# Altium footprint library chipfc_libs.PCBLIB: 391 footprints (part 4 of 25)
Each footprint in its own frame and in the unit in brackets; x right, y up, seen from the top. Pads: shape width x height; smd on the part's side, far side on the other; paste and mask are expansions set on the pad; w line width, h text height; cw(c..) or ccw(c..) is an arc to the next point about the centre after c.
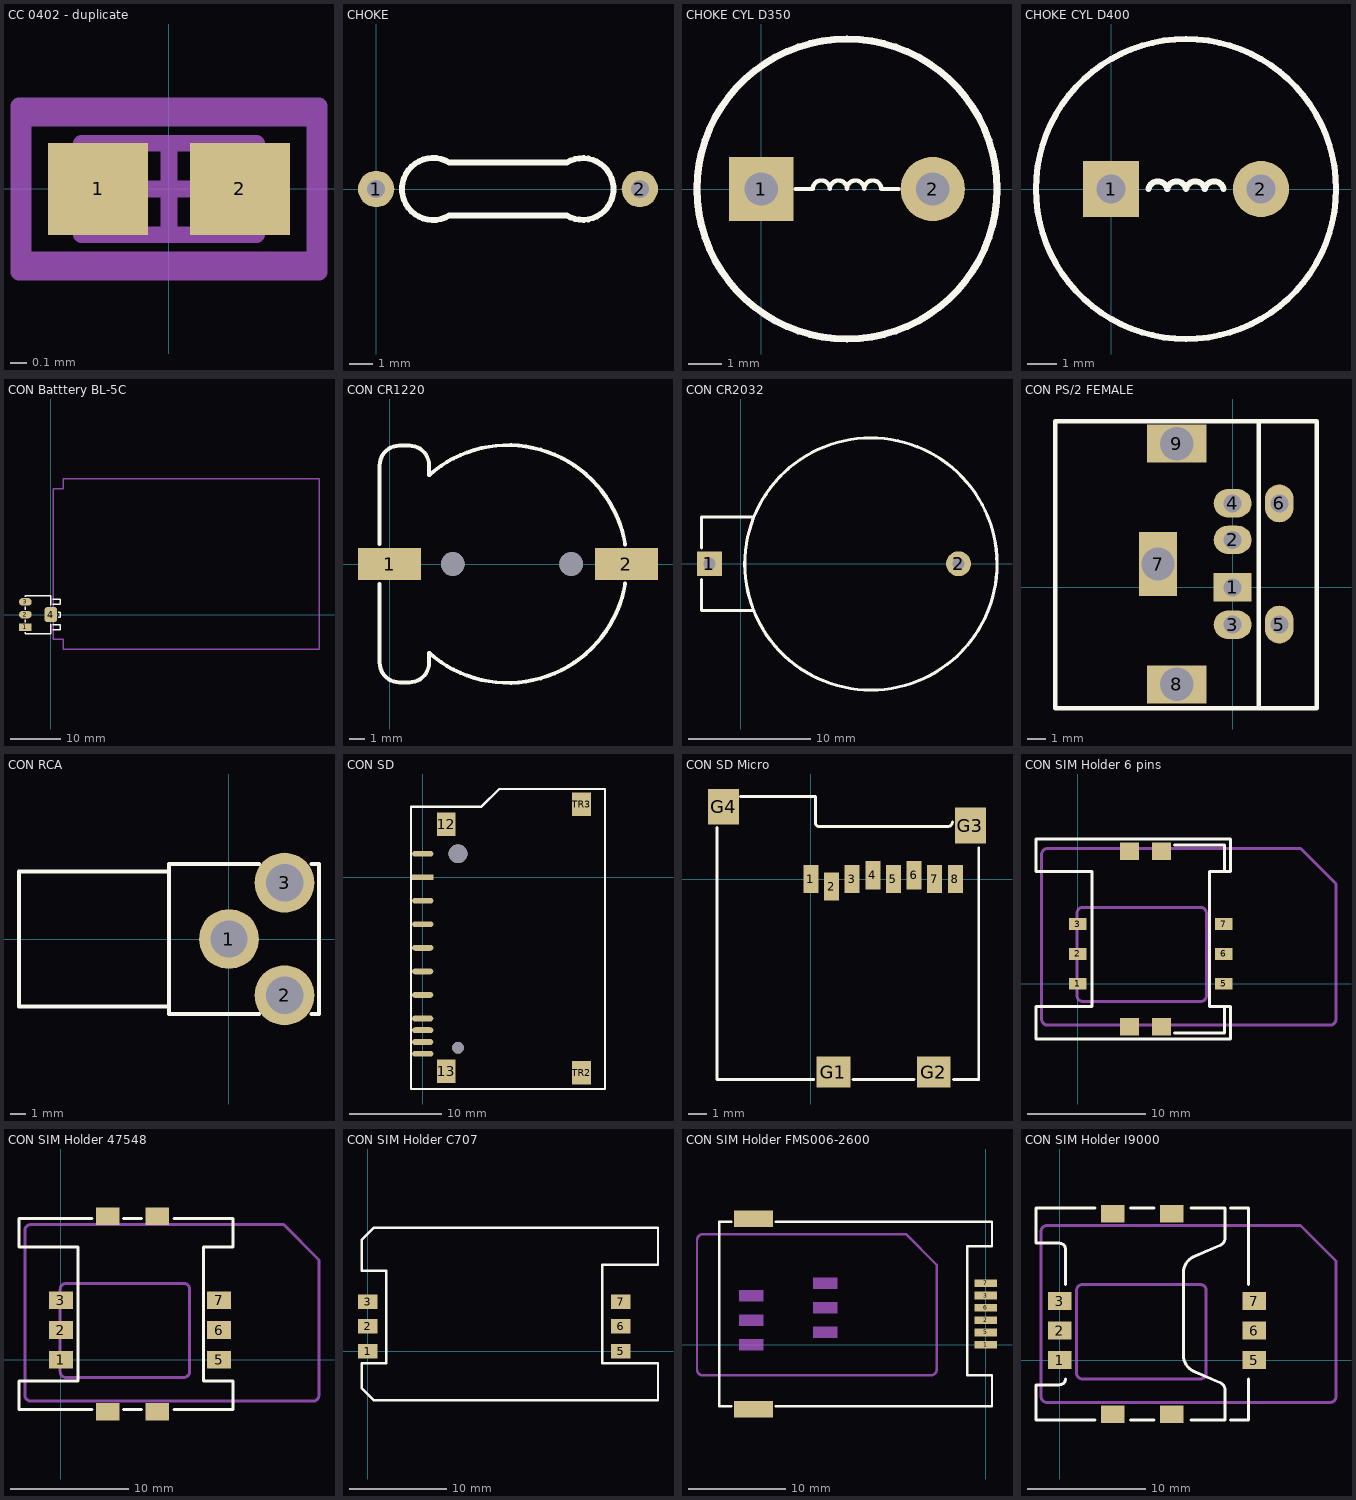
[diagram p3: the footprints below, top view; thin cyan lines are the x and y axes]

## CC 0402 - duplicate [mm] "Chip Capacitor, 2-Leads, Body 1.0x0.5mm, IPC Medium Density"
height 0.55
pads (2):
  rect 0.6x0.55 smd: 1(-0.425,0) 2(0.425,0)
Mechanical 13:
  lines w0.1: -0.525,-0.275 0.525,-0.275 0.525,0.275 -0.525,0.275 -0.525,-0.275
Mechanical 15:
  lines w0.1: -0.275,0 0.275,0 ; 0,-0.275 0,0.275 ; -0.875,-0.425 0.875,-0.425 0.875,0.425 -0.875,0.425 -0.875,-0.425
Mechanical 31:
  lines w0.1: -0.9,-0.5 0.9,-0.5 0.9,0.5 -0.9,0.5 -0.9,-0.5
3D body "User Library-CAPC1005X06.step": height 0.6, standoff 0, extent -0.5,-0.25 0.5,0.25

## CHOKE [mil]
pads (2):
  round 62 / inner round 52 / far side round 62 hole 31: 1(0,0) 2(450,0)
Top Overlay:
  lines w10: 125,-45 cw(c97.03,0) 125,45 325,45 cw(c352.35,0) 325,-45 125,-45

## CHOKE CYL D350 [mil]
pads (2):
  rect 75x75 hole 39: 1(0,0)
  round 75 hole 39: 2(200,0)
Top Overlay:
  lines w5: 40,0 50,0 60,0 cw(c70,0) 80,0 cw(c90,0) 100,0 cw(c110,0) 120,0 cw(c130,0) 140,0 150,0 160,0
  lines w8: -75,0 ccw(c100,0) 100,-175 ccw(c100,0) 275,0 ccw(c100,0) 100,175 ccw(c100,0) -75,0
Mechanical 1:
  lines w8: -75,0 cw(c100,0) 100,175 cw(c100,0) 275,0 cw(c100,0) 100,-175 cw(c100,0) -75,0

## CHOKE CYL D400 [mil]
pads (2):
  rect 75x75 / inner round 60 / far side rect 75x75 hole 39: 1(0,0)
  round 75 / inner round 60 / far side round 75 hole 39: 2(200,0)
Top Overlay:
  lines w8: 50,0 cw(c62.5,-2.5) 75,0 cw(c87.5,-2.5) 100,0 cw(c112.5,-2.5) 125,0 cw(c137.5,-2.5) 150,0 ; -100,0 cw(c100,0) 100,200 cw(c100,0) 300,0 cw(c100,0) 100,-200 cw(c100,0) -100,0
Mechanical 1:
  lines w8: -100,0 ccw(c100,0) 100,-200 ccw(c100,0) 300,0 ccw(c100,0) 100,200 ccw(c100,0) -100,0

## CON Batttery BL-5C [mil]
pads (4):
  rect 100x60 smd: 1(-200,-100)
  oval 100x60 smd: 2(-200,0) 3(-200,100)
  rrect50% 100x120 smd: 4(0,0)
Top Overlay:
  lines w10: -200,-140 -200,-150 0,-150 0,-75 ; -200,-60 -200,-40 ; -200,40 -200,60 ; -200,140 -200,150 0,150 0,75 ; 15,-120 75,-120 75,-80 15,-80 ; 15,80 75,80 75,120 15,120 ; 60,-20 75,-20 75,20 60,20
Mechanical 1:
  lines w10: 19.69,-193.11 98.43,-193.11 98.43,-271.85 2106.3,-271.85 2106.3,1066.73 98.43,1066.73 98.43,987.99 19.69,987.99 19.69,-193.11

## CON CR1220 [mil]
height 393.7
pads (4):
  rect 160x80 smd: 1(0,0) 2(600,0)
  round 60 hole 60 unplated: ""(160,0) ""(460,0)
Top Overlay:
  lines w10: -25,-50 -25,-250 ccw(c25,-250) 25,-300 50,-300 ccw(c50,-250) 100,-250 100,-225 ccw(c300,0) 596.94,-49.49 ; -25,50 -25,250 cw(c25,250) 25,300 50,300 cw(c50,250) 100,250 100,225 cw(c300,0) 596.94,49.49
3D body "User Library-cr1220.STEP": height 159.49, standoff -35, extent -64.17,-295.43 664.17,295

## CON CR2032 [mil]
height 393.7
pads (2):
  rect 80x80 / inner round 60 / far side rect 80x80 hole 39: 1(-100,0)
  round 80 / inner round 60 / far side round 80 hole 39: 2(700,0)
Top Overlay:
  lines w10: -125,-50 -125,-150 40,-150 ; -125,50 -125,150 40,150 ; 823.4,-0.8 cw(c418.4,-0.8) 823.4,-0.09
3D body "User Library-CR 2032 (Battery Holder)-1.step": height 278.5, standoff -136.85, extent -232.09,-447.83 897.83,447.83

## CON PS/2 FEMALE [mil]
pads (9):
  rect 80x60 / inner rect 90x65 / far side rect 80x60 hole 38: 1(0,0)
  oval 80x60 hole 38: 2(0,100) 3(0,-78.67) 4(0,177)
  oval 60x80 hole 38: 5(98.33,-78.67) 6(98.33,177)
  rect 80x135 / inner round 60 / far side rect 80x135 hole 70: 7(-157.33,49.17)
  rect 125x80 / inner round 60 / far side rect 125x80 hole 70: 8(-118,-204.53) 9(-118,302.87)
Top Overlay:
  lines w10: 55,-250 55,350 ; -373.98,-255 177.15,-255 177.15,350 -373.98,350 -373.98,-255

## CON RCA [mm]
pads (3):
  round 4 / inner round 1.524 / far side round 4 hole 2.499: 1(0,0) 2(3.7,-3.75) 3(3.7,3.75)
Top Overlay:
  lines w0.254: -4,-4.5 -14,-4.5 -14,4.5 -4,4.5 ; 2,-5 -4,-5 -4,5 2,5 ; 5.5,-5 6,-5 6,5 5.5,5

## CON SD [mil]
pads (17):
  rect 90x25 smd: 1(0,0)
  oval 90x25 smd: 2(0,-100) 3(0,-200) 4(0,-300) 5(0,-400) 6(0,-500) 7(0,-600) 8(0,-650) 9(0,100) 10(0,-700) 11(0,-750)
  rect 80x100 smd: 12(100,225) 13(100,-825) TR2(675,-830) TR3(675,310)
  round 80 hole 80: HOLD1(150,100)
  round 50 hole 50: HOLD2(150,-725)
Top Overlay:
  lines w10: -50,-900 -50,300 250,300 325,375 775,375 775,-900 -50,-900

## CON SD Micro [mil]
pads (12):
  rect 31.5x59.03 smd: 1(0,0) 2(43.27,-15.73) 3(86.53,0) 4(129.8,7.87) 5(173.07,0) 6(216.33,7.87) 7(259.6,0) 8(302.87,0)
  rect 70.87x65 smd: G1(47.2,-405.13) G2(257.63,-405.13)
  rect 65x74.8 smd: G3(334.33,112.1) G4(-182.9,151.43)
Top Overlay:
  lines w6: -196.67,108.17 -196.67,-420.87 5.9,-420.87 ; -147.5,173.07 9.83,173.07 9.83,116.03 ccw(c16.72,117) 15.73,110.13 285.17,110.13 ; 88.5,-420.87 216.33,-420.87 ; 287.13,110.13 ccw(c287.13,119.97) 296.97,119.97 ; 298.93,-420.87 352.03,-420.87 352.03,64.9
3D body "User Library-micro sd soket.step": height 66.02, standoff -2.09, extent -200,-439.96 374.8,189.96

## CON SIM Holder 6 pins [mm]
pads (10):
  rect 1.5x1 smd: 1(0,0) 2(0,2.54) 3(0,5.08) 5(12.4,0) 6(12.4,2.54) 7(12.4,5.08)
  rect 1.6x1.5 smd: ""(4.4,-3.64) ""(4.4,11.26) ""(7.1,-3.64) ""(7.1,11.26)
Top Overlay:
  lines w0.254: 8.2,-4.19 12.45,-4.19 12.45,-1.94 ; 8.2,11.81 12.45,11.81 12.45,9.56 ; -3.55,-4.69 -3.55,-1.94 1.2,-1.94 1.2,9.56 -3.55,9.56 -3.55,12.31 12.95,12.31 12.95,9.56 11.2,9.56 11.2,-1.94 12.95,-1.94 12.95,-4.69 -3.55,-4.69
Mechanical 1:
  lines w0.254: -3.07,-3 ccw(c-2.57,-3) -2.57,-3.5 21.43,-3.5 ccw(c21.43,-3) 21.93,-3 21.93,8.5 18.93,11.5 -2.57,11.5 ccw(c-2.57,11) -3.07,11 -3.07,-3 ; -0.07,-1 ccw(c0.43,-1) 0.43,-1.5 10.43,-1.5 ccw(c10.43,-1) 10.93,-1 10.93,6 ccw(c10.43,6) 10.43,6.5 0.43,6.5 ccw(c0.43,6) -0.07,6 -0.07,-1

## CON SIM Holder 47548 [mm] "Molex's SIM Holder,  6 pins"
pads (10):
  rect 2x1.5 smd: 1(0,0) 2(0,2.54) 3(0,5.08) 5(13.43,0) 6(13.43,2.54) 7(13.43,5.08) ""(3.97,-4.4) ""(3.97,12.2) ""(8.17,-4.4) ""(8.17,12.2)
Top Overlay:
  lines w0.254: 1.365,-1.8 -3.57,-1.8 -3.57,-4.2 2.635,-4.2 ; 1.365,9.6 -3.57,9.6 -3.57,12 2.635,12 ; 1.43,-1.8 1.43,9.6 ; 5.33,-4.2 6.83,-4.2 ; 5.33,12 6.83,12 ; 9.62,-4.2 14.63,-4.2 14.63,-1.8 12.16,-1.8 ; 9.62,12 14.63,12 14.63,9.6 12.16,9.6 ; 12.13,-1.8 12.13,9.6
Mechanical 1:
  lines w0.254: -3.07,-3 ccw(c-2.57,-3) -2.57,-3.5 21.43,-3.5 ccw(c21.43,-3) 21.93,-3 21.93,8.5 18.93,11.5 -2.57,11.5 ccw(c-2.57,11) -3.07,11 -3.07,-3 ; -0.07,-1 ccw(c0.43,-1) 0.43,-1.5 10.43,-1.5 ccw(c10.43,-1) 10.93,-1 10.93,6 ccw(c10.43,6) 10.43,6.5 0.43,6.5 ccw(c0.43,6) -0.07,6 -0.07,-1

## CON SIM Holder C707 [mm] "SIM Holder,  6 pins"
pads (6):
  rect 2x1.5 smd: 1(0,0) 2(0,2.54) 3(0,5.08) 5(26.035,0) 6(26.035,2.54) 7(26.035,5.08)
Top Overlay:
  lines w0.254: -0.635,-3.81 0.635,-5.08 29.845,-5.08 29.845,-1.27 24.13,-1.27 24.13,8.89 29.845,8.89 29.845,12.7 0.635,12.7 -0.635,11.43 -0.635,8.255 1.905,8.255 1.905,-1.27 -0.635,-1.27 -0.635,-3.81
3D body "User Library-SIMLOCK-1.step": height 2.5, standoff 0, extent -0.395,-4.854 29.605,12.446

## CON SIM Holder FMS006-2600 [mm] "SIM Holder,  6 pins"
pads (14):
  rect 2.3x0.8 smd: 1(0,0) 2(0,2.54) 3(0,5.08) 5(0,1.27) 6(0,3.81) 7(0,6.35)
  rect 2.5x1.2 on Mech1: ""(-24.25,0) ""(-24.25,2.54) ""(-24.25,5.08) ""(-16.6,1.27) ""(-16.6,3.81) ""(-16.6,6.35)
  rect 4x1.7 smd: ""(-24,-6.675) ""(-24,13.025)
Top Overlay:
  lines w0.254: -26.289,-6.35 -27.559,-6.35 -27.559,12.7 -26.289,12.7 ; -21.717,-6.35 0.635,-6.35 0.635,-3.175 -1.905,-3.175 -1.905,10.16 0.635,10.16 0.635,12.7 -21.717,12.7
Mechanical 1:
  lines w0.254: -29.845,-2.54 ccw(c-29.21,-2.54) -29.21,-3.175 -5.715,-3.175 ccw(c-5.715,-2.54) -5.08,-2.54 -5.08,8.255 -8.255,11.43 -29.21,11.43 ccw(c-29.21,10.795) -29.845,10.795 -29.845,-2.54

## CON SIM Holder I9000 [mm] "Molex's SIM Holder,  6 pins"
pads (10):
  rect 2x1.5 smd: 1(0,0) 2(0,2.5) 3(0,5) 5(16.5,0) 6(16.5,2.5) 7(16.5,5) ""(4.5,-4.6) ""(4.5,12.4) ""(9.5,-4.6) ""(9.5,12.4)
Top Overlay:
  lines w0.254: 0.5,-1.6 cw(c0,-1.6) 0,-2.1 -2,-2.1 -2,-5.1 3,-5.1 ; 3,12.9 -2,12.9 -2,9.9 0,9.9 cw(c0,9.4) 0.5,9.4 0.5,6.4 ; 6,-5.1 8,-5.1 ; 6,12.9 8,12.9 ; 11.12,-5.1 14,-5.1 14,-2.5 ; 11.12,12.9 14,12.9 14,10.3 ; 14.008,-2.5 ccw(c13.4,-2.5) 13.6,-1.926 11.504,-1.016 cw(c12,0.4) 10.5,0.4 10.5,7.4 cw(c12,7.4) 11.504,8.816 13.6,9.726 ccw(c13.4,10.3) 14.008,10.3 ; 14.5,-5.1 16,-5.1 16,-1.6 ; 14.5,12.9 16,12.9 16,6.4 ; 0.5,6.4 0.5,6.4
Mechanical 1:
  lines w0.254: -1.57,-3.1 ccw(c-1.07,-3.1) -1.07,-3.6 22.93,-3.6 ccw(c22.93,-3.1) 23.43,-3.1 23.43,8.4 20.43,11.4 -1.07,11.4 ccw(c-1.07,10.9) -1.57,10.9 -1.57,-3.1 ; 1.43,-1.1 ccw(c1.93,-1.1) 1.93,-1.6 11.93,-1.6 ccw(c11.93,-1.1) 12.43,-1.1 12.43,5.9 ccw(c11.93,5.9) 11.93,6.4 1.93,6.4 ccw(c1.93,5.9) 1.43,5.9 1.43,-1.1